# Altium footprint library hphonglib.PcbLib: 703 footprints (part 43 of 44)
Each footprint in its own frame and in the unit in brackets; x right, y up, seen from the top. Pads: shape width x height; smd on the part's side, far side on the other; paste and mask are expansions set on the pad; w line width, h text height; cw(c..) or ccw(c..) is an arc to the next point about the centre after c.
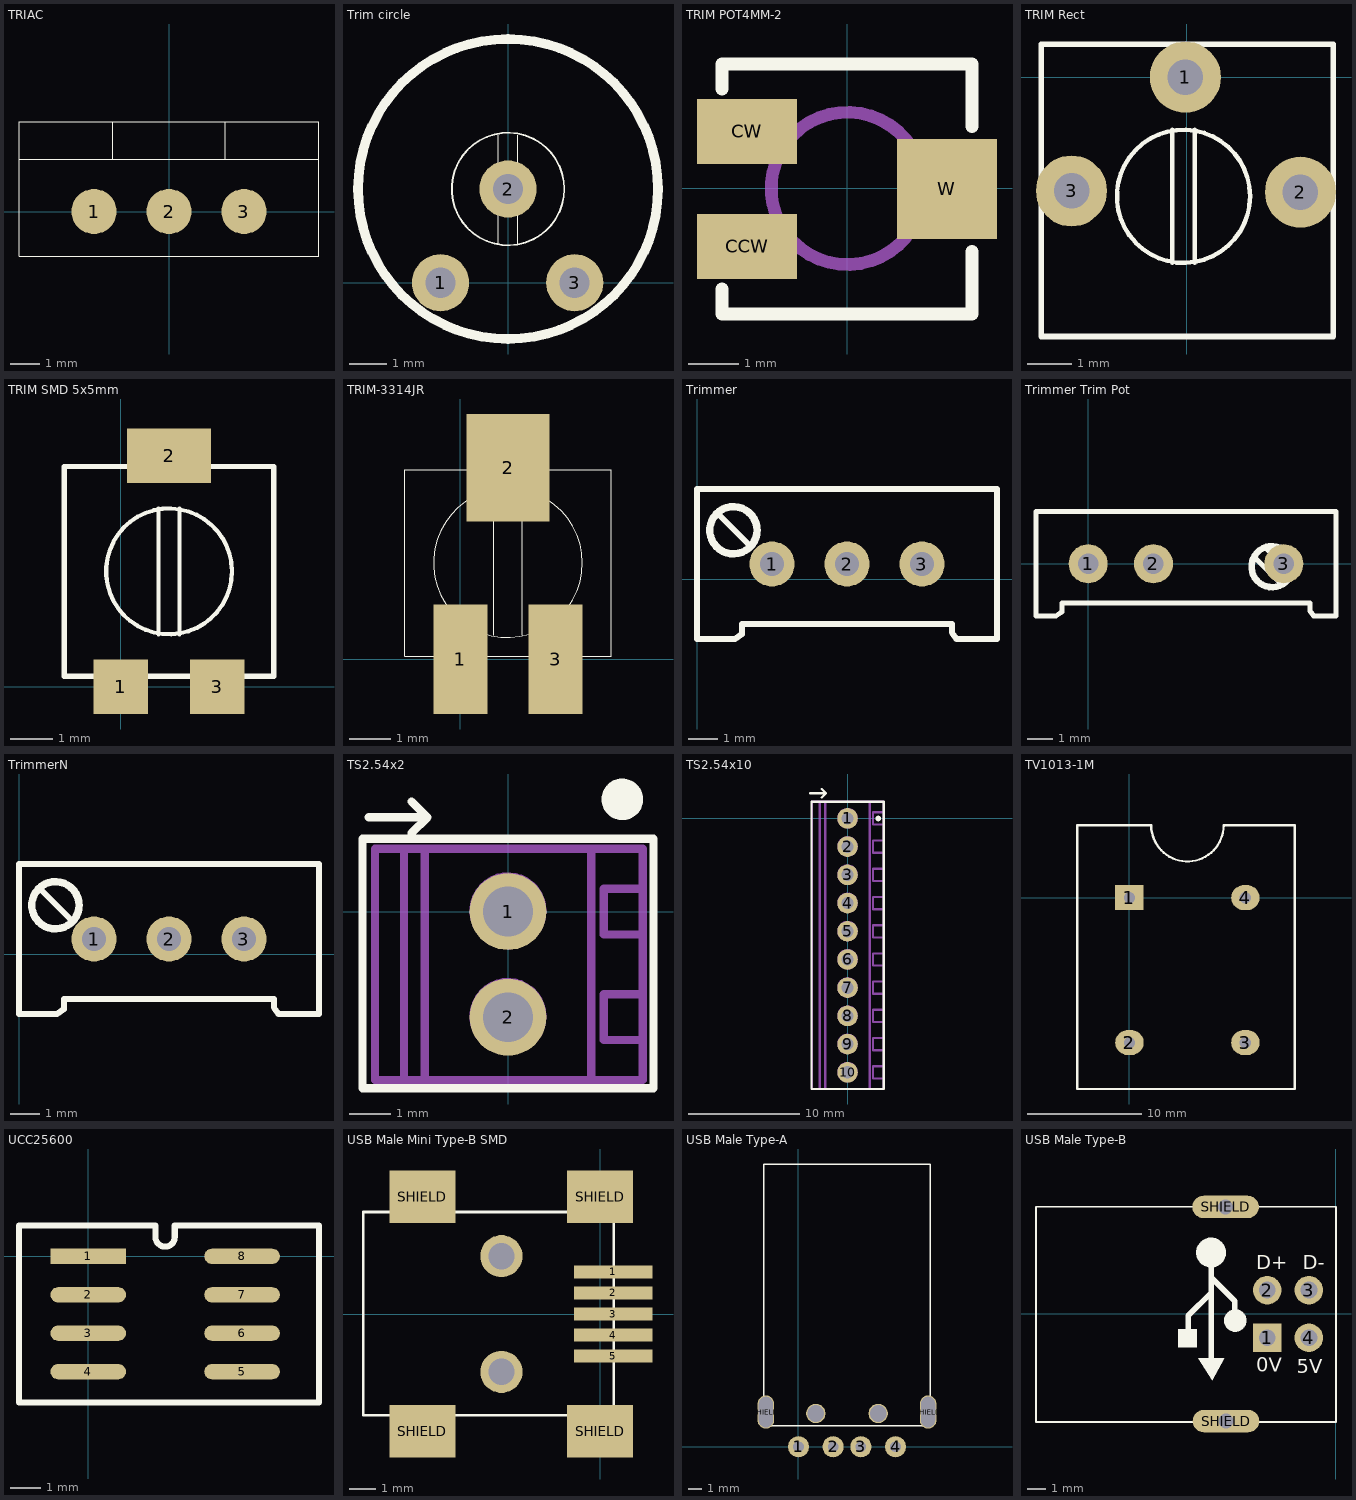
[diagram p42: the footprints below, top view; thin cyan lines are the x and y axes]

## TRIAC [mil]
pads (3):
  round 60 all layers, no hole: 1(-100,0) 2(0,0) 3(100,0)
Top Overlay:
  lines w1: -200,70 200,70 ; -75,70 -75,120 ; 75,70 75,120 ; -200,-60 200,-60 200,120 -200,120 -200,-60
Mechanical 1:
  text "TRIAC" at -85.5,-109 h38

## Trim circle [mil]
pads (3):
  round 60 hole 31.5: 1(-70.87,0) 2(0,98.43) 3(70,0)
Top Overlay:
  circle w10: c0,98.43 r157.48
  circle w1.97: c0,98.43 r59.06
  lines w1: -10,40 -10,155 ; 10,40 10,155
Bottom Overlay:
  circle w10: c0,98.43 r157.48
3D body: height 236.22, standoff 39.37, extent -157.97,-59.54 157.97,256.39
3D body: height 240.16, standoff 236.22, extent -59.55,39.08 59.55,157.97
3D body: height 240.55, standoff 236.22, extent -10.91,43.23 10.91,153.62

## TRIM POT4MM-2 [mm] "Bien tro tinh chinh"
pads (3):
  rect 2x1.3 smd: CCW(-2.008,-1.162) CW(-2.008,1.138)
  rect 2x2 smd: W(1.992,-0.012)
Top Overlay:
  lines w0.254: -2.508,-2.012 -2.508,-2.512 2.492,-2.512 2.492,-1.262 ; -2.508,1.988 -2.508,2.488 2.492,2.488 2.492,1.238
Mechanical 2:
  circle w0.254: c0,0 r1.524
3D body: height 2.67, standoff 0, extent -1.449,-1.449 1.449,1.449
3D body: height 2.54, standoff 0, extent -2.54,-2.413 2.54,2.413
3D body: height 0.64, standoff 0, extent -2.921,0.635 -1.143,1.651
3D body: height 0.64, standoff 0, extent -2.921,-1.651 -1.143,-0.635
3D body: height 0.64, standoff 0, extent 1.143,-0.889 2.921,0.889
3D body: height 3.05, standoff 0, extent -1.519,-1.532 1.519,-0.132
3D body: height 3.05, standoff 0, extent -1.519,0.132 1.519,1.532

## TRIM Rect [mm]
pads (3):
  round 1.6 hole 0.8: 1(-0.025,0) 2(2.565,-2.591) 3(-2.591,-2.565)
Top Overlay:
  circle w0.1: c-0.069,-2.686 r1.5
  lines w0.1: -0.319,-4.186 -0.319,-1.186 ; 0.181,-4.186 0.181,-1.186
  lines w0.127: -3.277,-5.842 3.302,-5.842 3.302,0.737 -3.277,0.737 -3.277,-5.842
3D body: height 4.4, standoff -3, extent -3.275,-5.867 3.325,0.733

## TRIM SMD 5x5mm [mm]
pads (3):
  rect 1.3x1.3 smd: 1(0,0) 3(2.3,0)
  rect 2x1.3 smd: 2(1.15,5.5)
Top Overlay:
  circle w0.1: c1.15,2.75 r1.5
  lines w0.1: 0.9,1.25 0.9,4.25 ; 1.4,1.25 1.4,4.25
  lines w0.127: -1.35,0.25 -1.35,5.25 3.65,5.25 3.65,0.25 -1.35,0.25

## TRIM-3314JR [mm]
pads (3):
  rect 1.3x2.65 smd: 1(0,0) 3(2.3,0)
  rect 2x2.6 smd: 2(1.15,4.625)
Top Overlay:
  circle w0.025: c1.15,2.325 r1.8
  lines w0.025: 0.8,0.575 0.8,4.075 ; 1.5,0.575 1.5,4.075 ; -1.35,0.075 -1.35,4.575 3.65,4.575 3.65,0.075 -1.35,0.075

## Trimmer [mil] "Trimmer Variable Resistor"
pads (3):
  round 60 hole 31.5: 1(100,20) 2(200,20) 3(300,20)
Top Overlay:
  circle w10: c48.5,65 r31.5
  lines w7.87: 30,85 69.37,45.63 ; 0,-80 0,120 400,120 400,-80 345.89,-80 340,-71.38 340,-60 60,-60 60,-73.61 50.64,-80 0,-80
Bottom Overlay:
  lines w7.87: 0,-80 0,120 400,120 400,-80 345.89,-80 340,-71.38 340,-60 60,-60 60,-73.61 50.64,-80 0,-80
3D body: height 500, standoff 0.5, extent 0,-80 400,120
3D body: height 98.43, standoff -39.37, extent 77.83,-2.23 121.99,41.92
3D body: height 98.43, standoff -39.37, extent 177.83,-2.23 221.99,41.92
3D body: height 98.43, standoff -39.37, extent 278.7,-0.84 322.85,43.32
3D body: height 551, standoff 50, extent 56.98,23.43 92.72,96.88
3D body: height 551, standoff 500, extent 11.4,23.12 47.14,96.57
3D body: height 550, standoff 500, extent 7.27,19.14 96.55,100.55

## Trimmer Trim Pot [mil] "Trimmer Trim Pot Variable Resistor 3296"
pads (3):
  round 60 hole 31.5: 1(0,0) 2(100,0) 3(300,0)
Top Overlay:
  circle w10: c281.91,-4.37 r31.5
  lines w7.87: 254.35,10.6 293.72,-28.77 ; 274.04,22.41 309.47,-13.03 ; -80,-80 -80,80 380,80 380,-80 345.89,-80 340,-71.38 340,-60 -40,-60 -40,-73.61 -49.36,-80 -80,-80
Bottom Overlay:
  lines w7.87: -79.72,-80.71 -37.4,-80.71 -37.4,-60.04 340.55,-60.04 340.55,-79.72 379.92,-79.72 379.92,79.92 -79.72,79.92 -79.72,-80.71
3D body: height 98.43, standoff -39.37, extent 277.83,-21.23 321.99,22.92
3D body: height 98.43, standoff -39.37, extent 77.83,-22.23 121.99,21.92
3D body: height 98.43, standoff -39.37, extent -22.17,-22.23 21.99,21.92
3D body: height 500, standoff 0.5, extent -80,-80 380,80
3D body: height 550, standoff 500, extent 237.27,-45.86 326.55,35.55
3D body: height 551, standoff 500, extent 241.4,-41.88 277.14,31.57
3D body: height 551, standoff 50, extent 286.98,-41.57 322.72,31.88

## TrimmerN [mil] "Trimmer Variable Resistor"
pads (3):
  round 60 hole 31.5: 1(100,20) 2(200,20) 3(300,20)
Top Overlay:
  circle w10: c48.5,65 r31.5
  lines w7.87: 30,85 69.37,45.63 ; 0,-80 50.64,-80 60,-73.61 60,-60 340,-60 340,-71.38 345.89,-80 400,-80 400,120 0,120 0,-80
Bottom Overlay:
  lines w7.87: 0,-80 50.64,-80 60,-73.61 60,-60 340,-60 340,-71.38 345.89,-80 400,-80 400,120 0,120 0,-80
3D body: height 454.72, standoff -251.97, extent 14.4,-74 389.6,116.2

## TS2.54x2 [mm] "Screw Terminal Strip, 2 Way, 2.54 mm Pitch"
pads (2):
  round 1.85 hole 1.2: 1(0,0) 2(0,-2.54)
Top Overlay:
  circle w0.5: c2.75,2.7 r0.25
  lines w0.2: -3.35,2.27 -1.94,2.27 ; -2.32,1.89 -1.94,2.27 ; -2.32,2.65 -1.94,2.27 ; -3.5,-4.25 -3.5,1.75 3.5,1.75 3.5,-4.25 -3.5,-4.25
Bottom Overlay:
  lines w0.1: -3.48,-4.267 3.48,-4.267 3.48,1.727 -3.48,1.727 -3.48,-4.267
Mechanical 13:
  text ".Designator" at 0.6,-2.925 h2.03
Mechanical 15:
  circle w0.254: c0,-2.52 r0.8
  circle w0.254: c0,0.02 r0.8
  lines w0.2: -2.5,-4.025 -2.5,1.44 ; -2,-4.025 -2,1.5 ; -0.7,-2.1 0.4,-3.2 ; -0.7,0.4 0.3,-0.6 ; -0.2,-1.84 0.7,-2.74 ; -0.2,0.7 0.7,-0.2 ; 2,-4.025 2,1.51 ; 3.2,-3.09 2.3,-3.09 2.3,-1.99 3.2,-1.99 ; 3.2,-0.55 2.3,-0.55 2.3,0.55 3.2,0.55 ; -3.2,1.51 -3.198,-4.05 3.24,-4.05 3.24,1.51 -3.2,1.51
3D body: height 4.5, standoff 0.01, extent -3.2,-4.025 3.25,1.5
3D body: height 8.5, standoff 4.5, extent -2.7,-4.025 2,1.5
3D body: height 2.5, standoff -1, extent -0.561,-0.561 0.561,0.561
3D body: height 2.5, standoff -1, extent -0.561,-3.101 0.561,-1.979
3D body: height 8.6, standoff 7.6, extent 0.129,-0.925 1.037,0.941
3D body: height 8.6, standoff 7.6, extent -1.029,-0.933 -0.121,0.933
3D body: height 8.6, standoff 7.6, extent -1.029,-3.483 -0.121,-1.617
3D body: height 8.6, standoff 7.6, extent 0.129,-3.475 1.037,-1.609
3D body: height 8.55, standoff 7.6, extent -1.134,-1.034 1.134,1.034
3D body: height 8.55, standoff 7.6, extent -1.134,-3.574 1.134,-1.506
3D body: height 3.5, standoff 1, extent 2.288,-0.762 3.275,0.755
3D body: height 3.5, standoff 1, extent 2.288,-3.287 3.275,-1.77

## TS2.54x10 [mm] "Screw Terminal Strip, 10 Way, 2.54 mm Pitch"
pads (10):
  round 1.85 hole 1.1: 1(0,0) 2(0,-2.54) 3(0,-5.08) 4(0,-7.62) 5(0,-10.16) 6(0,-12.7) 7(0,-15.24) 8(0,-17.78) 9(0,-20.32) 10(0,-22.86)
Top Overlay:
  circle w0.25: c2.76,-0.005 r0.125
  lines w0.2: -3.35,2.27 -1.94,2.27 ; -2.32,1.89 -1.94,2.27 ; -2.32,2.65 -1.94,2.27 ; -3.25,-24.36 3.25,-24.36 3.25,1.5 -3.25,1.5 -3.25,-24.36
Mechanical 13:
  text ".Designator" at 0.61,-14.884 h2.03
Mechanical 15:
  circle w0.254: c0,0.02 r0.8
  circle w0.254: c0,-2.52 r0.8
  circle w0.254: c0,-5.06 r0.8
  circle w0.254: c0,-7.6 r0.8
  circle w0.254: c0,-10.14 r0.8
  circle w0.254: c0,-12.68 r0.8
  circle w0.254: c0,-15.22 r0.8
  circle w0.254: c0,-17.76 r0.8
  circle w0.254: c0,-20.3 r0.8
  circle w0.254: c0,-22.84 r0.8
  lines w0.2: -2.5,1.44 -2.5,-24.36 ; -2,-24.3 -2,1.5 ; -0.7,-2.1 0.4,-3.2 ; -0.7,0.4 0.3,-0.6 ; -0.62,-22.43 0.4,-23.44 ; -0.62,-19.93 0.37,-20.92 ; -0.62,-17.39 0.37,-18.38 ; -0.62,-14.84 0.38,-15.84 ; -0.62,-12.32 0.33,-13.27 ; -0.6,-7.2 0.4,-8.2 ; -0.6,-4.7 0.3,-5.6 ; -0.59,-9.79 0.39,-10.77 ; -0.2,-22.16 0.7,-23.06 ; -0.2,-19.62 0.7,-20.52 ; -0.2,-17.08 0.7,-17.98 ; -0.2,-14.54 0.7,-15.44 ; -0.2,-12 0.7,-12.9 ; -0.2,-9.46 0.7,-10.36 ; -0.2,-6.92 0.7,-7.82 ; -0.2,-4.38 0.7,-5.28 ; -0.2,-1.84 0.7,-2.74 ; -0.2,0.7 0.7,-0.2 ; 2,-24.36 2,1.51 ; 3.2,-23.41 2.3,-23.41 2.3,-22.31 3.2,-22.31 ; 3.2,-20.87 2.3,-20.87 2.3,-19.77 3.2,-19.77 ; 3.2,-18.33 2.3,-18.33 2.3,-17.23 3.2,-17.23 ; 3.2,-15.79 2.3,-15.79 2.3,-14.69 3.2,-14.69 ; 3.2,-13.25 2.3,-13.25 2.3,-12.15 3.2,-12.15 ; 3.2,-10.71 2.3,-10.71 2.3,-9.61 3.2,-9.61 ; 3.2,-8.17 2.3,-8.17 2.3,-7.07 3.2,-7.07 ; 3.2,-5.63 2.3,-5.63 2.3,-4.53 3.2,-4.53 ; 3.2,-3.09 2.3,-3.09 2.3,-1.99 3.2,-1.99 ; 3.2,-0.55 2.3,-0.55 2.3,0.55 3.2,0.55 ; -2.5,-24.36 -3.19,-24.35 -3.2,1.51 3.24,1.51 3.24,-24.35 -2.5,-24.36

## TV1013-1M [mm]
pads (4):
  rect 2.5x2.2 / inner rect 2.5x1.2 / far side rect 2.5x2.2 hole 1: 1(0,0)
  oval 2.5x2.2 / inner oval 2.5x1.2 / far side oval 2.5x2.2 hole 1: 2(0,-12.7) 3(10.16,-12.7) 4(10.16,0)
Top Overlay:
  lines w0.2: -4.572,-16.764 -4.572,6.35 1.905,6.35 ccw(c5.08,6.35) 8.255,6.35 14.478,6.35 14.478,-16.764 -4.572,-16.764

## UCC25600 [mm] "Half bridge resonant"
pads (8):
  rect 2.5x0.5 smd: 1(0,0)
  oval 2.5x0.5 smd: 2(0,-1.27) 3(0,-2.54) 4(0,-3.81) 5(5.08,-3.81) 6(5.08,-2.54) 7(5.08,-1.27) 8(5.08,0)
Top Overlay:
  lines w0.2: -2.286,-4.826 7.62,-4.826 7.62,1.016 2.857,1.016 2.857,0.635 cw(c2.54,0.635) 2.222,0.635 2.222,1.016 -2.286,1.016 -2.286,-4.826

## USB Male Mini Type-B SMD [mm] "USB Male Mini Type B Conn"
pads (11):
  rect 3x0.5 smd: 1(0.5,1.6) 2(0.5,0.8) 3(0.5,0) 4(0.5,-0.8) 5(0.5,-1.6)
  rect 2.5x2 smd: SHIELD(-6.75,-4.45) SHIELD(-6.75,4.45) SHIELD(0,4.45) SHIELD(0,-4.45)
  round 1.6 hole 1: ""(-3.75,-2.2) ""(-3.75,2.2)
Top Overlay:
  lines w0.1: -9,-3.85 -9,3.875 0.525,3.875 0.525,-3.85 -9,-3.85
  text "." at 1.325,2.6 h0.5
3D body: height 1, standoff 0.1, extent -7.512,3.925 -5.988,5.05
3D body: height 1, standoff 0.1, extent -0.962,3.9 0.562,5.025
3D body: height 1, standoff 0.1, extent -0.987,-4.975 0.537,-3.85
3D body: height 1, standoff 0.1, extent -7.537,-4.975 -6.013,-3.85
3D body: height 3.9, standoff 0.01, extent -9.675,-3.85 0.525,3.875

## USB Male Type-A [mm] "USB Male Type A Connector"
pads (8):
  round 1.524 hole 0.762: 1(0,0) 2(2.5,0) 3(4.5,0) 4(7,0)
  rrect100% 1.2x2.4 hole 1 slot 2.2 at 90 deg: SHIELD(-2.35,2.5) SHIELD(9.35,2.5)
  round 1.4 hole 1.2: ""(1.25,2.4) ""(5.75,2.4)
Top Overlay:
  lines w0.1: -2.5,1.5 -2.5,20.4 9.5,20.4 9.5,1.5 -2.5,1.5
Bottom Overlay:
  lines w0.1: -2.489,-1.245 9.525,-1.245 9.525,5.486 -2.489,5.486 -2.489,-1.245
3D body: height 3.5, standoff 1.7, extent -2.5,1.5 9.5,5.5
3D body: height 3.5, standoff 0.01, extent -2.5,5.5 9.5,20.4
3D body: height 1.7, standoff -1.2, extent -2.5,1.5 -2.2,3.5
3D body: height 1.7, standoff -1.2, extent 9.2,1.5 9.5,3.5
3D body: height 1.7, standoff -1.6, extent 6.7,-0.2 7.3,0.2
3D body: height 1.7, standoff 1.4, extent 6.7,0.2 7.3,1.5
3D body: height 1.7, standoff 1.4, extent 4.2,0.2 4.8,1.5
3D body: height 1.7, standoff 1.4, extent 2.2,0.2 2.8,1.5
3D body: height 1.7, standoff 1.4, extent -0.3,0.2 0.3,1.5
3D body: height 1.7, standoff -1.6, extent 4.2,-0.2 4.8,0.2
3D body: height 1.7, standoff -1.6, extent 2.2,-0.2 2.8,0.2
3D body: height 1.7, standoff -1.6, extent -0.3,-0.2 0.3,0.2

## USB Male Type-B [mm] "USB Male Type B Connector"
pads (6):
  rect 1.524x1.524 hole 0.9: 1(-3.672,-1.27)
  round 1.524 hole 0.9: 2(-3.672,1.27) 3(-1.449,1.27) 4(-1.449,-1.27)
  rrect100% 3.556x1.2 hole 0.8: SHIELD(-5.894,5.715) SHIELD(-5.875,-5.725)
Top Overlay:
  circle w0.6: c-5.382,-0.356 r0.3
  circle w0.8: c-6.674,3.277 r0.4
  region: -8.433,-0.813 -8.433,-1.803 -7.417,-1.803 -7.417,-0.813
  region: -6.617,-3.531 -7.353,-2.362 -5.956,-2.362
  lines w0.1: -16.025,-5.775 -16.025,5.725 0,5.725 0,-5.775 -16.025,-5.775
  lines w0.2: -6.655,1.876 -6.629,1.876 -6.604,1.876
  lines w0.3: -7.899,-0.864 -7.899,-0.127 ; -7.899,-0.102 -6.655,1.143 ; -6.655,-2.464 -6.655,2.718 ; -6.604,1.876 -5.41,0.683 -5.41,-0.279
  lines w0.8: -6.934,5.725 -4.826,5.725 ; -6.915,-5.715 -4.807,-5.715
  text "0V" at -4.267,-3.099 h0.76
  text "D-" at -1.778,2.388 h0.76
  text "D+" at -4.267,2.388 h0.76
  text "5V" at -2.108,-3.175 h0.76
Bottom Overlay:
  circle w0.8: c-6.699,3.277 r0.4
  circle w0.6: c-5.407,-0.356 r0.3
  region: -8.458,-0.813 -8.458,-1.803 -7.442,-1.803 -7.442,-0.813
  region: -6.642,-3.531 -7.379,-2.362 -5.982,-2.362
  lines w0.1: -16.025,-5.775 -16.025,5.725 ; 0,-5.775 0,5.725 ; -16.025,-5.766 -16.025,5.725 ; -16.025,-5.766 0,-5.766 ; -16.025,-5.766 0,-5.766 ; -16.025,5.725 0,5.725 ; -16.025,5.725 0,5.725 ; 0,-5.766 0,5.725
  lines w0.3: -7.925,-0.864 -7.925,-0.127 ; -7.925,-0.102 -6.68,1.143 ; -6.68,-2.464 -6.68,2.718 ; -6.629,1.876 -5.436,0.683 -5.436,-0.279
3D body: height 11, standoff 0.01, extent -3.644,-5.791 -0.014,5.709
3D body: height 11, standoff 0.01, extent -16.025,-5.775 -3.708,5.725